# Altium footprint library PCB_LIB.PcbLib: 116 footprints (part 4 of 8)
Each footprint in its own frame and in the unit in brackets; x right, y up, seen from the top. Pads: shape width x height; smd on the part's side, far side on the other; paste and mask are expansions set on the pad; w line width, h text height; cw(c..) or ccw(c..) is an arc to the next point about the centre after c.
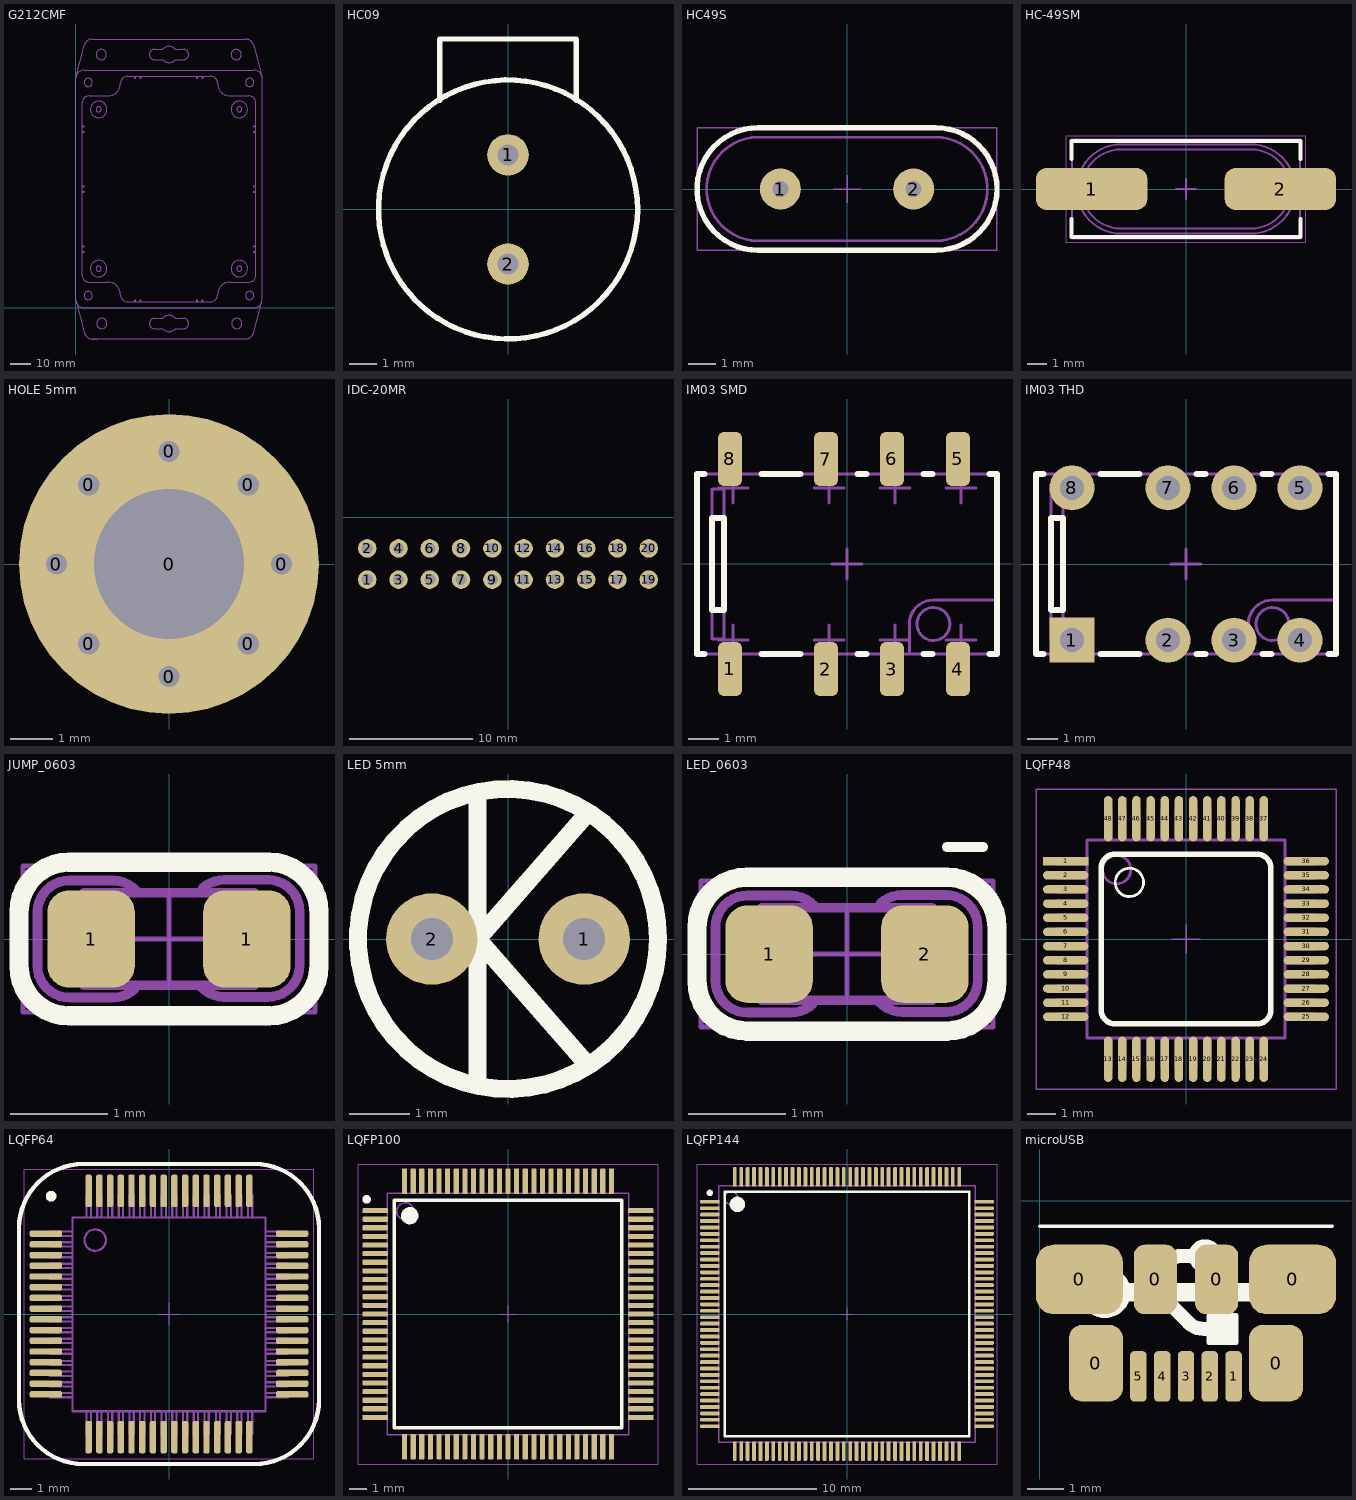
[diagram p3: the footprints below, top view; thin cyan lines are the x and y axes]

## G212CMF [mm]
Mechanical 1:
  circle w0.1: c77.75,-7.5 r2.5
  circle w0.1: c12.5,-7.5 r2.5
  circle w0.1: c84,6 r2
  circle w0.1: c79,19 r1.25
  circle w0.1: c79,19 r4
  circle w0.1: c6,6 r2
  circle w0.1: c11,19 r1.25
  circle w0.1: c11,19 r4
  circle w0.1: c79,96 r4
  circle w0.1: c79,96 r1.25
  circle w0.1: c84,109 r2
  circle w0.1: c11,96 r4
  circle w0.1: c11,96 r1.25
  circle w0.1: c6,109 r2
  circle w0.1: c77.5,122.5 r2.5
  circle w0.1: c12.25,122.5 r2.5
  lines w0.1: 3,27 4,27 4,27.5 3,27.5 ; 3,29.5 4,29.5 4,30 3,30 ; 3,55 3,99.086 cw(c6.414,99.086) 6.414,102.5 15.5,102.5 ccw(c15.5,108.5) 21.5,108.5 cw(c25,108.5) 25,112 ; 3,56 4,56 4,56.5 3,56.5 ; 3,58.5 4,58.5 4,59 3,59 ; 3,60 3,15.914 ccw(c6.414,15.914) 6.414,12.5 15.5,12.5 cw(c15.5,6.5) 21.5,6.5 ccw(c25,6.5) 25,3 ; 3,85 4,85 4,85.5 3,85.5 ; 3,87.5 4,87.5 4,88 3,88 ; 7.5,-15 80,-15 82,-15 ; 8,-15 10,-15 ; 8,130 10,130 82.5,130 ; 8.025,-15 cw(c8.025,-11) 4.158,-12.023 0,4 ; 8.025,130 ccw(c8.025,126) 4.158,127.023 0,111 ; 28.5,3 28.5,4 29,4 29,3 ; 28.5,112 28.5,111 29,111 29,112 ; 31,3 31,4 31.5,4 31.5,3 ; 31,112 31,111 31.5,111 31.5,112 ; 58.5,3 58.5,4 59,4 59,3 ; 58.5,112 58.5,111 59,111 59,112 ; 61,3 61,4 61.5,4 61.5,3 ; 61,112 61,111 61.5,111 61.5,112 ; 80,130 82,130 ; 81.975,-15 ccw(c81.975,-11) 85.842,-12.023 90,4 ; 81.975,130 cw(c81.975,126) 85.842,127.023 90,111 ; 87,27 86,27 86,27.5 87,27.5 ; 87,29.5 86,29.5 86,30 87,30 ; 87,55 87,99.086 ccw(c83.586,99.086) 83.586,102.5 74.5,102.5 cw(c74.5,108.5) 68.5,108.5 ccw(c65,108.5) 65,112 ; 87,56 86,56 86,56.5 87,56.5 ; 87,58.5 86,58.5 86,59 87,59 ; 87,60 87,15.914 cw(c83.586,15.914) 83.586,12.5 74.5,12.5 ccw(c74.5,6.5) 68.5,6.5 cw(c65,6.5) 65,3 ; 87,85 86,85 86,85.5 87,85.5 ; 87,87.5 86,87.5 86,88 87,88 ; 0,4 ccw(c4,4) 4,0 ; 0,4 ccw(c4,4) 4,0 ; 0,4 0,111 ; 0,111 cw(c4,111) 4,115 86,115 cw(c86,111) 90,111 ; 4,0 86,0 ; 4,0 86,0 ; 25,3 52,3 25,3 ; 25,112 52,112 25,112 ; 65,3 38,3 65,3 ; 65,112 38,112 65,112 ; 86,0 ccw(c86,4) 90,4 ; 86,0 ccw(c86,4) 90,4 ; 90,4 90,111 ; 38,-10 cw(c38,-7.5) 38,-5 42,-5 cw(c45,-7.5) 48,-5 52,-5 cw(c52,-7.5) 52,-10 48,-10 cw(c45,-7.5) 42,-10 38,-10 ; 38,120 cw(c38,122.5) 38,125 42,125 cw(c45,122.5) 48,125 52,125 cw(c52,122.5) 52,120 48,120 cw(c45,122.5) 42,120 38,120

## HC09 [mil]
pads (2):
  round 60 hole 30: 1(0,78.74) 2(0,-78.74)
Top Overlay:
  circle w7.87: c0,0 r187.01
  lines w7.87: -98.43,157.48 -98.43,246.06 ; 98.43,157.48 98.43,246.06 ; -98.43,246.06 -98.42,246.06 ; -98.43,246.06 -98.42,246.06 ; -98.42,246.06 98.43,246.06 ; 98.43,246.06 98.43,246.06

## HC49S [mm]
pads (2):
  round 1.5 hole 0.6: 1(-2.44,0) 2(2.44,0)
Top Overlay:
  lines w0.2: 3.239,-2.25 -3.25,-2.25 cw(c-3.25,0) -3.25,2.25 3.24,2.25 cw(c3.25,0) 3.239,-2.25
Mechanical 14:
  lines w0.1: 3.239,-2.25 -3.25,-2.25 cw(c-3.25,0) -3.25,2.25 3.24,2.25 cw(c3.25,0) 3.239,-2.25 ; -3.25,-1.9 cw(c-3.25,0) -3.25,1.9 3.242,1.9 cw(c3.25,0) 3.241,-1.9 -3.25,-1.9
  text ".Comment" at -2.5,-1.5 h1.5
  text ".Designator" at -5.75,-0.5 h2.8
Mechanical 15:
  lines w0.05: -0.5,0 0.5,0 ; 0,-0.5 0,0.5 ; -5.5,-2.25 5.5,-2.25 5.5,2.25 -5.5,2.25 -5.5,-2.25
3D body "HP49US.STEP": height 3.7, standoff -2.5, extent -5.5,-2.25 5.5,2.25

## HC-49SM [mm] "Crystal, 2-Leads, Body 4.70x11.40mm, Pitch 8.80mm, IPC Medium Density"
height 4.2
pads (2):
  rrect50% 5.6x2.1 smd: 1(-4.75,0) 2(4.75,0)
Top Overlay:
  lines w0.2: -5.775,-1.5 -5.775,-2.425 5.775,-2.425 5.775,-1.5 ; -5.775,1.5 -5.775,2.425 5.775,2.425 5.775,1.5
Mechanical 14:
  lines w0.1: -5.75,-1 -7,-1 cw(c-7,-0.5) -7.5,-0.5 -7.5,0.5 cw(c-7,0.5) -7,1 -5.75,1 ; -5.75,-0.5 -6.5,-0.5 -6.5,0.5 -5.75,0.5 ; 5.75,-1 7,-1 ccw(c7,-0.5) 7.5,-0.5 7.5,0.5 ccw(c7,0.5) 7,1 5.75,1 ; 5.75,-0.5 6.5,-0.5 6.5,0.5 5.75,0.5 ; -5.75,-2.5 5.75,-2.5 5.75,2.5 -5.75,2.5 -5.75,-2.5 ; -3.25,-2.25 cw(c-3.25,0) -3.25,2.25 3.25,2.25 cw(c3.25,0) 3.25,-2.25 -3.25,-2.25 ; -3.25,-2 cw(c-3.25,0) -3.25,2 3.25,2 cw(c3.25,0) 3.25,-2 -3.25,-2
  text ".Designator" at -5.825,-0.575 h2.8
  text ".Comment" at -2.75,-1.5 h1.5
Mechanical 15:
  lines w0.05: -6.025,-2.675 6.025,-2.675 6.025,2.675 -6.025,2.675 -6.025,-2.675
  lines w0.1: -0.5,0 0.5,0 ; 0,-0.5 0,0.5
3D body "HC49US SMT Crystal.STEP": height 4.2, standoff 0, extent -6.35,-2.35 6.35,2.35

## HOLE 5mm [mil]
pads (9):
  round 60 hole 19.68: 0(-103.35,0) 0(-73.53,-73.2) 0(-73.53,72.96) 0(0,-103.35) 0(0,103.35) 0(72.62,-73.2) 0(72.62,72.96) 0(103.35,0)
  round 275.59 hole 137.8: 0(0,0)

## IDC-20MR [mm]
pads (20):
  round 1.5 hole 0.9: 1(-11.43,-5.08) 2(-11.43,-2.54) 3(-8.89,-5.08) 4(-8.89,-2.54) 5(-6.35,-5.08) 6(-6.35,-2.54) 7(-3.81,-5.08) 8(-3.81,-2.54) 9(-1.27,-5.08) 10(-1.27,-2.54) 11(1.27,-5.08) 12(1.27,-2.54) 13(3.81,-5.08) 14(3.81,-2.54) 15(6.35,-5.08) 16(6.35,-2.54) 17(8.89,-5.08) 18(8.89,-2.54) 19(11.43,-5.08) 20(11.43,-2.54)
3D body "User Library-DS1013-20R (IDC-20R CONNFLY).step": height 8.9, standoff -3, extent -16.6,-5.4 16.6,8.62

## IM03 SMD [mm] "Relay, 8 Leads, Row Spacing 5.08 mm; Body 14.5mm x 7.2mm, AXICOM P2 Serie"
height 9.9
pads (8):
  rrect50% 0.8x1.8 smd: 1(-3.9,-3.5) 2(-0.7,-3.5) 3(1.5,-3.5) 4(3.7,-3.5) 5(3.7,3.5) 6(1.5,3.5) 7(-0.7,3.5) 8(-3.9,3.5)
Top Overlay:
  lines w0.2: -4.744,-3 -5,-3 -5,3 -4.744,3 ; -2.856,-3 -1.544,-3 ; -2.856,3 -1.544,3 ; 0.344,-3 0.656,-3 ; 0.344,3 0.656,3 ; 2.544,-3 2.856,-3 ; 2.544,3 2.856,3 ; 4.744,-3 5,-3 5,3 4.744,3 ; -4.5,-1.534 -4.5,1.534 -4.1,1.534 -4.1,-1.534 -4.5,-1.534
Mechanical 8:
  lines w0.1: -4.3,-2.54 -3.8,-2.54 ; -4.3,2.54 -3.8,2.54 ; -3.8,-3.04 -3.8,-2.54 ; -3.8,-2.04 -3.8,-2.54 ; -3.8,2.04 -3.8,2.54 ; -3.8,3.04 -3.8,2.54 ; -3.3,-2.54 -3.8,-2.54 ; -3.3,2.54 -3.8,2.54 ; -1.1,-2.54 -0.6,-2.54 ; -1.1,2.54 -0.6,2.54 ; -0.6,-3.04 -0.6,-2.54 ; -0.6,-2.04 -0.6,-2.54 ; -0.6,2.04 -0.6,2.54 ; -0.6,3.04 -0.6,2.54 ; -0.5,0 0,0 ; -0.1,-2.54 -0.6,-2.54 ; -0.1,2.54 -0.6,2.54 ; 0,-0.5 0,0 ; 0,0.5 0,0 ; 0.5,0 0,0 ; 1.1,-2.54 1.6,-2.54 ; 1.1,2.54 1.6,2.54 ; 1.6,-3.04 1.6,-2.54 ; 1.6,-2.04 1.6,-2.54 ; 1.6,2.04 1.6,2.54 ; 1.6,3.04 1.6,2.54 ; 2.1,-2.54 1.6,-2.54 ; 2.1,2.54 1.6,2.54 ; 3.3,-2.54 3.8,-2.54 ; 3.3,2.54 3.8,2.54 ; 3.8,-3.04 3.8,-2.54 ; 3.8,-2.04 3.8,-2.54 ; 3.8,2.04 3.8,2.54 ; 3.8,3.04 3.8,2.54 ; 4.3,-2.54 3.8,-2.54 ; 4.3,2.54 3.8,2.54
Mechanical 14:
  circle w0.1: c2.88,-2 r0.55
  lines w0.1: 2.08,-3 2.08,-2 cw(c2.88,-2) 2.88,-1.2 5,-1.2 ; -5,-3 5,-3 5,3 -5,3 -5,-3 ; -4.5,-2.5 -4.5,2.5 -4.1,2.5 -4.1,-2.5 -4.5,-2.5
  text ".Designator" at -6.096,0.203 h3
  text ".Comment" at -3.277,-1.118 h2
3D body "REL_OMRON_G6K-2F.stp": height 5.4, standoff 0, extent -5.1,-3.9 5.1,3.9

## IM03 THD [mm] "Relay, 8 Leads, Row Spacing 5.08 mm; Body 14.5mm x 7.2mm, AXICOM P2 Serie"
height 9.9
pads (8):
  rect 1.5x1.5 hole 0.8: 1(-3.8,-2.54)
  round 1.5 hole 0.8: 2(-0.6,-2.54) 3(1.6,-2.54) 4(3.8,-2.54) 5(3.8,2.54) 6(1.6,2.54) 7(-0.6,2.54) 8(-3.8,2.54)
Top Overlay:
  lines w0.2: -4.744,-3 -5,-3 -5,3 -4.744,3 ; -2.856,-3 -1.544,-3 ; -2.856,3 -1.544,3 ; 0.344,-3 0.656,-3 ; 0.344,3 0.656,3 ; 2.544,-3 2.856,-3 ; 2.544,3 2.856,3 ; 4.744,-3 5,-3 5,3 4.744,3 ; -4.5,-1.534 -4.1,-1.534 -4.1,1.534 -4.5,1.534 -4.5,-1.534
Mechanical 8:
  lines w0.1: -4.3,-2.54 -3.8,-2.54 ; -4.3,2.54 -3.8,2.54 ; -3.8,-3.04 -3.8,-2.54 ; -3.8,-2.04 -3.8,-2.54 ; -3.8,2.04 -3.8,2.54 ; -3.8,3.04 -3.8,2.54 ; -3.3,-2.54 -3.8,-2.54 ; -3.3,2.54 -3.8,2.54 ; -1.1,-2.54 -0.6,-2.54 ; -1.1,2.54 -0.6,2.54 ; -0.6,-3.04 -0.6,-2.54 ; -0.6,-2.04 -0.6,-2.54 ; -0.6,2.04 -0.6,2.54 ; -0.6,3.04 -0.6,2.54 ; -0.5,0 0,0 ; -0.1,-2.54 -0.6,-2.54 ; -0.1,2.54 -0.6,2.54 ; 0,-0.5 0,0 ; 0,0.5 0,0 ; 0.5,0 0,0 ; 1.1,-2.54 1.6,-2.54 ; 1.1,2.54 1.6,2.54 ; 1.6,-3.04 1.6,-2.54 ; 1.6,-2.04 1.6,-2.54 ; 1.6,2.04 1.6,2.54 ; 1.6,3.04 1.6,2.54 ; 2.1,-2.54 1.6,-2.54 ; 2.1,2.54 1.6,2.54 ; 3.3,-2.54 3.8,-2.54 ; 3.3,2.54 3.8,2.54 ; 3.8,-3.04 3.8,-2.54 ; 3.8,-2.04 3.8,-2.54 ; 3.8,2.04 3.8,2.54 ; 3.8,3.04 3.8,2.54 ; 4.3,-2.54 3.8,-2.54 ; 4.3,2.54 3.8,2.54
Mechanical 14:
  circle w0.1: c2.88,-2 r0.55
  lines w0.1: 2.08,-3 2.08,-2 cw(c2.88,-2) 2.88,-1.2 5,-1.2 ; -5,-3 -5,3 5,3 5,-3 -5,-3 ; -4.5,-2.5 -4.1,-2.5 -4.1,2.5 -4.5,2.5 -4.5,-2.5
  text ".Comment" at -3.277,-1.118 h2
  text ".Designator" at -6.096,0.203 h3
3D body "REL_TYCO_IMXXTX.stp": height 5.65, standoff -2.6, extent -5,-3 5,3

## JUMP_0603 [mm] "Chip Resistor, EIA 0603, Metric 1608, Body 1.6x0.8mm, IPC Medium Density"
height 0.55
pads (2):
  rrect50% 0.9x1 smd: 1(-0.8,0) 1(0.8,0)
Top Overlay:
  lines w0.2: -1.54,-0.275 ccw(c-1.025,-0.275) -1.025,-0.79 1.025,-0.79 ccw(c1.025,-0.275) 1.54,-0.275 1.54,0.275 ccw(c1.025,0.275) 1.025,0.79 -1.025,0.79 ccw(c-1.025,0.275) -1.54,0.275 -1.54,-0.275
Mechanical 14:
  lines w0.1: -0.358,-0.519 cw(c-0.575,-0.275) -0.575,-0.601 ; -0.333,0.493 ccw(c-0.575,0.275) -0.575,0.601 -1.025,0.601 ccw(c-1.025,0.275) -1.351,0.275 -1.351,-0.275 ccw(c-1.025,-0.275) -1.025,-0.601 -0.575,-0.601 ; 0.324,-0.487 ccw(c0.567,-0.269) 0.567,-0.595 1.017,-0.595 ccw(c1.017,-0.269) 1.343,-0.269 1.343,0.281 ccw(c1.017,0.281) 1.017,0.607 0.567,0.607 ; 0.35,0.525 cw(c0.567,0.281) 0.567,0.607 ; -0.575,-0.601 -0.575,-0.601 ; 0.567,0.607 0.567,0.607 ; -0.875,-0.475 -0.875,0.475 0.875,0.475 0.875,-0.475 -0.875,-0.475
  text ".Designator" at -1.397,-0.127 h0.7
  text ".Comment" at -0.508,-0.381 h0.3
Mechanical 15:
  lines w0.05: -0.5,0 0.5,0 ; 0,-0.5 0,0.5 ; -1.5,-0.75 1.5,-0.75 1.5,0.75 -1.5,0.75 -1.5,-0.75
3D body "RESC1608X55N.stp": height 0.55, standoff 0, extent -0.875,-0.475 0.875,0.475

## LED 5mm [mil]
pads (2):
  round 60 hole 27.56: 1(50,0) 2(-50,0)
Top Overlay:
  circle w11.81: c0,0 r98.43
  lines w11.81: -20,-90 -20,90 ; 50,-80 -20,0 50,80

## LED_0603 [mm] "Chip Resistor, EIA 0603, Metric 1608, Body 1.6x0.8mm, IPC Medium Density"
height 0.55
pads (2):
  rrect50% 0.9x1 smd: 1(-0.8,0) 2(0.8,0)
Top Overlay:
  lines w0.1: 1.025,1.1 1.4,1.1
  lines w0.2: -1.54,-0.275 ccw(c-1.025,-0.275) -1.025,-0.79 1.025,-0.79 ccw(c1.025,-0.275) 1.54,-0.275 1.54,0.275 ccw(c1.025,0.275) 1.025,0.79 -1.025,0.79 ccw(c-1.025,0.275) -1.54,0.275 -1.54,-0.275
Mechanical 14:
  lines w0.1: -0.358,-0.519 cw(c-0.575,-0.275) -0.575,-0.601 ; -0.333,0.493 ccw(c-0.575,0.275) -0.575,0.601 -1.025,0.601 ccw(c-1.025,0.275) -1.351,0.275 -1.351,-0.275 ccw(c-1.025,-0.275) -1.025,-0.601 -0.575,-0.601 ; 0.324,-0.487 ccw(c0.567,-0.269) 0.567,-0.595 1.017,-0.595 ccw(c1.017,-0.269) 1.343,-0.269 1.343,0.281 ccw(c1.017,0.281) 1.017,0.607 0.567,0.607 ; 0.35,0.525 cw(c0.567,0.281) 0.567,0.607 ; -0.575,-0.601 -0.575,-0.601 ; 0.567,0.607 0.567,0.607 ; -0.875,-0.475 0.875,-0.475 0.875,0.475 -0.875,0.475 -0.875,-0.475
  text ".Comment" at -0.508,-0.381 h0.3
  text ".Designator" at -1.397,-0.127 h0.7
Mechanical 15:
  lines w0.05: -0.5,0 0.5,0 ; 0,-0.5 0,0.5 ; -1.5,-0.75 -1.5,0.75 1.5,0.75 1.5,-0.75 -1.5,-0.75
3D body "User Library-led0603_GRE.step": height 1.1, standoff 0, extent -0.81,-0.4 0.81,0.4

## LQFP48 [mm] "QFP, 0.50mm Pitch, Square, 12 pin X 12 Pin, 7.00mm X 7.00mm X 1.20mm Body, IPC Medium Density"
height 1.2
pads (48):
  rect 1.6x0.3 smd: 1(-4.25,2.75)
  rrect100% 1.6x0.3 smd: 2(-4.25,2.25) 3(-4.25,1.75) 4(-4.25,1.25) 5(-4.25,0.75) 6(-4.25,0.25) 7(-4.25,-0.25) 8(-4.25,-0.75) 9(-4.25,-1.25) 10(-4.25,-1.75) 11(-4.25,-2.25) 12(-4.25,-2.75) 25(4.25,-2.75) 26(4.25,-2.25) 27(4.25,-1.75) 28(4.25,-1.25) 29(4.25,-0.75) 30(4.25,-0.25) 31(4.25,0.25) 32(4.25,0.75) 33(4.25,1.25) 34(4.25,1.75) 35(4.25,2.25) 36(4.25,2.75)
  rrect100% 0.3x1.6 smd: 13(-2.75,-4.25) 14(-2.25,-4.25) 15(-1.75,-4.25) 16(-1.25,-4.25) 17(-0.75,-4.25) 18(-0.25,-4.25) 19(0.25,-4.25) 20(0.75,-4.25) 21(1.25,-4.25) 22(1.75,-4.25) 23(2.25,-4.25) 24(2.75,-4.25) 37(2.75,4.25) 38(2.25,4.25) 39(1.75,4.25) 40(1.25,4.25) 41(0.75,4.25) 42(0.25,4.25) 43(-0.25,4.25) 44(-0.75,4.25) 45(-1.25,4.25) 46(-1.75,4.25) 47(-2.25,4.25) 48(-2.75,4.25)
Top Overlay:
  circle w0.1: c-2,2 r0.5
  lines w0.2: -3,-2.5 ccw(c-2.5,-2.5) -2.5,-3 2.5,-3 ccw(c2.5,-2.5) 3,-2.5 3,-2 3,2.5 ccw(c2.5,2.5) 2.5,3 -2.5,3 ccw(c-2.5,2.5) -3,2.5 -3,-2.5
Mechanical 14:
  circle w0.1: c-2.45,2.45 r0.5
  lines w0.1: -3.5,-2.85 -4.55,-2.85 -4.55,-2.65 -3.5,-2.65 ; -3.5,-2.35 -4.55,-2.35 -4.55,-2.15 -3.5,-2.15 ; -3.5,-1.85 -4.55,-1.85 -4.55,-1.65 -3.5,-1.65 ; -3.5,-1.35 -4.55,-1.35 -4.55,-1.15 -3.5,-1.15 ; -3.5,-0.85 -4.55,-0.85 -4.55,-0.65 -3.5,-0.65 ; -3.5,-0.35 -4.55,-0.35 -4.55,-0.15 -3.5,-0.15 ; -3.5,0.15 -4.55,0.15 -4.55,0.35 -3.5,0.35 ; -3.5,0.65 -4.55,0.65 -4.55,0.85 -3.5,0.85 ; -3.5,1.15 -4.55,1.15 -4.55,1.35 -3.5,1.35 ; -3.5,1.65 -4.55,1.65 -4.55,1.85 -3.5,1.85 ; -3.5,2.15 -4.55,2.15 -4.55,2.35 -3.5,2.35 ; -3.5,2.65 -4.55,2.65 -4.55,2.85 -3.5,2.85 ; -2.85,-3.5 -2.85,-4.55 -2.65,-4.55 -2.65,-3.5 ; -2.85,3.5 -2.85,4.55 -2.65,4.55 -2.65,3.5 ; -2.35,-3.5 -2.35,-4.55 -2.15,-4.55 -2.15,-3.5 ; -2.35,3.5 -2.35,4.55 -2.15,4.55 -2.15,3.5 ; -1.85,-3.5 -1.85,-4.55 -1.65,-4.55 -1.65,-3.5 ; -1.85,3.5 -1.85,4.55 -1.65,4.55 -1.65,3.5 ; -1.35,-3.5 -1.35,-4.55 -1.15,-4.55 -1.15,-3.5 ; -1.35,3.5 -1.35,4.55 -1.15,4.55 -1.15,3.5 ; -0.85,-3.5 -0.85,-4.55 -0.65,-4.55 -0.65,-3.5 ; -0.85,3.5 -0.85,4.55 -0.65,4.55 -0.65,3.5 ; -0.35,-3.5 -0.35,-4.55 -0.15,-4.55 -0.15,-3.5 ; -0.35,3.5 -0.35,4.55 -0.15,4.55 -0.15,3.5 ; 0.15,-3.5 0.15,-4.55 0.35,-4.55 0.35,-3.5 ; 0.15,3.5 0.15,4.55 0.35,4.55 0.35,3.5 ; 0.65,-3.5 0.65,-4.55 0.85,-4.55 0.85,-3.5 ; 0.65,3.5 0.65,4.55 0.85,4.55 0.85,3.5 ; 1.15,-3.5 1.15,-4.55 1.35,-4.55 1.35,-3.5 ; 1.15,3.5 1.15,4.55 1.35,4.55 1.35,3.5 ; 1.65,-3.5 1.65,-4.55 1.85,-4.55 1.85,-3.5 ; 1.65,3.5 1.65,4.55 1.85,4.55 1.85,3.5 ; 2.15,-3.5 2.15,-4.55 2.35,-4.55 2.35,-3.5 ; 2.15,3.5 2.15,4.55 2.35,4.55 2.35,3.5 ; 2.65,-3.5 2.65,-4.55 2.85,-4.55 2.85,-3.5 ; 2.65,3.5 2.65,4.55 2.85,4.55 2.85,3.5 ; 3.5,-2.85 4.55,-2.85 4.55,-2.65 3.5,-2.65 ; 3.5,-2.35 4.55,-2.35 4.55,-2.15 3.5,-2.15 ; 3.5,-1.85 4.55,-1.85 4.55,-1.65 3.5,-1.65 ; 3.5,-1.35 4.55,-1.35 4.55,-1.15 3.5,-1.15 ; 3.5,-0.85 4.55,-0.85 4.55,-0.65 3.5,-0.65 ; 3.5,-0.35 4.55,-0.35 4.55,-0.15 3.5,-0.15 ; 3.5,0.15 4.55,0.15 4.55,0.35 3.5,0.35 ; 3.5,0.65 4.55,0.65 4.55,0.85 3.5,0.85 ; 3.5,1.15 4.55,1.15 4.55,1.35 3.5,1.35 ; 3.5,1.65 4.55,1.65 4.55,1.85 3.5,1.85 ; 3.5,2.15 4.55,2.15 4.55,2.35 3.5,2.35 ; 3.5,2.65 4.55,2.65 4.55,2.85 3.5,2.85 ; -3.5,-3.5 3.5,-3.5 3.5,3.5 -3.5,3.5 -3.5,-3.5
  text ".Comment" at -1.75,-3 h1
  text ".Designator" at -6.25,-1.25 h3
Mechanical 15:
  lines w0.05: -0.5,0 0.5,0 ; 0,-0.5 0,0.5 ; -5.3,-5.3 5.3,-5.3 5.3,5.3 -5.3,5.3 -5.3,-5.3
3D body "QFP50P900X900X120-48N.stp": height 1.2, standoff 0, extent -4.6,-4.6 4.6,4.6

## LQFP64 [mm] "QFP, 0.50mm Pitch, Square; 64 Pin, 10.00mm L X 10.00mm W X 1.00mm H body (w/thermal tab 3.42 X 3.42mm), IPC Medium Density"
height 1
pads (64):
  rrect50% 1.5x0.3 smd: 1(-5.75,3.75) 2(-5.75,3.25) 3(-5.75,2.75) 4(-5.75,2.25) 5(-5.75,1.75) 6(-5.75,1.25) 7(-5.75,0.75) 8(-5.75,0.25) 9(-5.75,-0.25) 10(-5.75,-0.75) 11(-5.75,-1.25) 12(-5.75,-1.75) 13(-5.75,-2.25) 14(-5.75,-2.75) 15(-5.75,-3.25) 16(-5.75,-3.75) 33(5.75,-3.75) 34(5.75,-3.25) 35(5.75,-2.75) 36(5.75,-2.25) 37(5.75,-1.75) 38(5.75,-1.25) 39(5.75,-0.75) 40(5.75,-0.25) 41(5.75,0.25) 42(5.75,0.75) 43(5.75,1.25) 44(5.75,1.75) 45(5.75,2.25) 46(5.75,2.75) 47(5.75,3.25) 48(5.75,3.75)
  rrect50% 0.3x1.5 smd: 17(-3.75,-5.75) 18(-3.25,-5.75) 19(-2.75,-5.75) 20(-2.25,-5.75) 21(-1.75,-5.75) 22(-1.25,-5.75) 23(-0.75,-5.75) 24(-0.25,-5.75) 25(0.25,-5.75) 26(0.75,-5.75) 27(1.25,-5.75) 28(1.75,-5.75) 29(2.25,-5.75) 30(2.75,-5.75) 31(3.25,-5.75) 32(3.75,-5.75) 49(3.75,5.75) 50(3.25,5.75) 51(2.75,5.75) 52(2.25,5.75) 53(1.75,5.75) 54(1.25,5.75) 55(0.75,5.75) 56(0.25,5.75) 57(-0.25,5.75) 58(-0.75,5.75) 59(-1.25,5.75) 60(-1.75,5.75) 61(-2.25,5.75) 62(-2.75,5.75) 63(-3.25,5.75) 64(-3.75,5.75)
Top Overlay:
  circle w0.25: c-5.5,5.5 r0.125
  lines w0.2: -7,-4 ccw(c-4,-4) -4,-7 4,-7 ccw(c4,-4) 7,-4 7,4 ccw(c4,4) 4,7 -4,7 ccw(c-4,4) -7,4 -7,-4
Mechanical 14:
  drawing of 197 lines, arcs and shapes, not listed
  text ".Designator" at -10.338,-2.032 h3.5
  text ".Comment" at -8.179,-8.687 h1.5
Mechanical 15:
  lines w0.05: -0.5,0 0.5,0 ; 0,-0.5 0,0.5 ; -6.75,-6.75 6.75,-6.75 6.75,6.75 -6.75,6.75 -6.75,-6.75
3D body "QFP50P1200X1200X100-65N-S342.stp": height 1, standoff 0, extent -6.1,-6.1 6.1,6.1

## LQFP100 [mm] "QFP, 0.50mm Pitch, Square; 100 Pin,14.00mm L X 14.00mm W X 1.20mm H Body, IPC Medium Density"
height 1.2
pads (100):
  rrect50% 1.5x0.3 smd: 1(-7.7,6) 2(-7.7,5.5) 3(-7.7,5) 4(-7.7,4.5) 5(-7.7,4) 6(-7.7,3.5) 7(-7.7,3) 8(-7.7,2.5) 9(-7.7,2) 10(-7.7,1.5) 11(-7.7,1) 12(-7.7,0.5) 13(-7.7,0) 14(-7.7,-0.5) 15(-7.7,-1) 16(-7.7,-1.5) 17(-7.7,-2) 18(-7.7,-2.5) 19(-7.7,-3) 20(-7.7,-3.5) 21(-7.7,-4) 22(-7.7,-4.5) 23(-7.7,-5) 24(-7.7,-5.5) 25(-7.7,-6) 51(7.7,-6) 52(7.7,-5.5) 53(7.7,-5) 54(7.7,-4.5) 55(7.7,-4) 56(7.7,-3.5) 57(7.7,-3) 58(7.7,-2.5) 59(7.7,-2) 60(7.7,-1.5) 61(7.7,-1) 62(7.7,-0.5) 63(7.7,0) 64(7.7,0.5) 65(7.7,1) 66(7.7,1.5) 67(7.7,2) 68(7.7,2.5) 69(7.7,3) 70(7.7,3.5) 71(7.7,4) 72(7.7,4.5) 73(7.7,5) 74(7.7,5.5) 75(7.7,6)
  rrect50% 0.3x1.5 smd: 26(-6,-7.7) 27(-5.5,-7.7) 28(-5,-7.7) 29(-4.5,-7.7) 30(-4,-7.7) 31(-3.5,-7.7) 32(-3,-7.7) 33(-2.5,-7.7) 34(-2,-7.7) 35(-1.5,-7.7) 36(-1,-7.7) 37(-0.5,-7.7) 38(0,-7.7) 39(0.5,-7.7) 40(1,-7.7) 41(1.5,-7.7) 42(2,-7.7) 43(2.5,-7.7) 44(3,-7.7) 45(3.5,-7.7) 46(4,-7.7) 47(4.5,-7.7) 48(5,-7.7) 49(5.5,-7.7) 50(6,-7.7) 76(6,7.7) 77(5.5,7.7) 78(5,7.7) 79(4.5,7.7) 80(4,7.7) 81(3.5,7.7) 82(3,7.7) 83(2.5,7.7) 84(2,7.7) 85(1.5,7.7) 86(1,7.7) 87(0.5,7.7) 88(0,7.7) 89(-0.5,7.7) 90(-1,7.7) 91(-1.5,7.7) 92(-2,7.7) 93(-2.5,7.7) 94(-3,7.7) 95(-3.5,7.7) 96(-4,7.7) 97(-4.5,7.7) 98(-5,7.7) 99(-5.5,7.7) 100(-6,7.7)
Top Overlay:
  circle w0.5: c-5.7,5.7 r0.25
  circle w0.25: c-8.2,6.65 r0.125
  lines w0.2: -6.6,-6.6 -6.6,6.6 6.6,6.6 6.6,-6.6 -6.6,-6.6
Mechanical 14:
  circle w0.1: c-5.95,5.95 r0.5
  lines w0.1: -7,7 -7,-7 7,-7 7,7 ; -7,7 7,7 ; -7,7 7,7
Mechanical 15:
  lines w0.05: -0.5,0 0.5,0 ; 0,-0.5 0,0.5 ; -8.7,-8.7 8.7,-8.7 8.7,8.7 -8.7,8.7 -8.7,-8.7
3D body "QFP50P1600X1600X120-100N.stp": height 1.2, standoff 0, extent -8,-8 8,8

## LQFP144 [mm] "QFP, 144-Leads, Body 20x20mm (BSC), Pitch 0.50mm, IPC Medium Density"
height 1.6
pads (144):
  rrect50% 1.5x0.3 smd: 1(-10.7,8.75) 2(-10.7,8.25) 3(-10.7,7.75) 4(-10.7,7.25) 5(-10.7,6.75) 6(-10.7,6.25) 7(-10.7,5.75) 8(-10.7,5.25) 9(-10.7,4.75) 10(-10.7,4.25) 11(-10.7,3.75) 12(-10.7,3.25) 13(-10.7,2.75) 14(-10.7,2.25) 15(-10.7,1.75) 16(-10.7,1.25) 17(-10.7,0.75) 18(-10.7,0.25) 19(-10.7,-0.25) 20(-10.7,-0.75) 21(-10.7,-1.25) 22(-10.7,-1.75) 23(-10.7,-2.25) 24(-10.7,-2.75) 25(-10.7,-3.25) 26(-10.7,-3.75) 27(-10.7,-4.25) 28(-10.7,-4.75) 29(-10.7,-5.25) 30(-10.7,-5.75) 31(-10.7,-6.25) 32(-10.7,-6.75) 33(-10.7,-7.25) 34(-10.7,-7.75) 35(-10.7,-8.25) 36(-10.7,-8.75) 73(10.7,-8.75) 74(10.7,-8.25) 75(10.7,-7.75) 76(10.7,-7.25) 77(10.7,-6.75) 78(10.7,-6.25) 79(10.7,-5.75) 80(10.7,-5.25) 81(10.7,-4.75) 82(10.7,-4.25) 83(10.7,-3.75) 84(10.7,-3.25) 85(10.7,-2.75) 86(10.7,-2.25) 87(10.7,-1.75) 88(10.7,-1.25) 89(10.7,-0.75) 90(10.7,-0.25) 91(10.7,0.25) 92(10.7,0.75) 93(10.7,1.25) 94(10.7,1.75) 95(10.7,2.25) 96(10.7,2.75) 97(10.7,3.25) 98(10.7,3.75) 99(10.7,4.25) 100(10.7,4.75) 101(10.7,5.25) 102(10.7,5.75) 103(10.7,6.25) 104(10.7,6.75) 105(10.7,7.25) 106(10.7,7.75) 107(10.7,8.25) 108(10.7,8.75)
  rrect50% 0.3x1.5 smd: 37(-8.75,-10.7) 38(-8.25,-10.7) 39(-7.75,-10.7) 40(-7.25,-10.7) 41(-6.75,-10.7) 42(-6.25,-10.7) 43(-5.75,-10.7) 44(-5.25,-10.7) 45(-4.75,-10.7) 46(-4.25,-10.7) 47(-3.75,-10.7) 48(-3.25,-10.7) 49(-2.75,-10.7) 50(-2.25,-10.7) 51(-1.75,-10.7) 52(-1.25,-10.7) 53(-0.75,-10.7) 54(-0.25,-10.7) 55(0.25,-10.7) 56(0.75,-10.7) 57(1.25,-10.7) 58(1.75,-10.7) 59(2.25,-10.7) 60(2.75,-10.7) 61(3.25,-10.7) 62(3.75,-10.7) 63(4.25,-10.7) 64(4.75,-10.7) 65(5.25,-10.7) 66(5.75,-10.7) 67(6.25,-10.7) 68(6.75,-10.7) 69(7.25,-10.7) 70(7.75,-10.7) 71(8.25,-10.7) 72(8.75,-10.7) 109(8.75,10.7) 110(8.25,10.7) 111(7.75,10.7) 112(7.25,10.7) 113(6.75,10.7) 114(6.25,10.7) 115(5.75,10.7) 116(5.25,10.7) 117(4.75,10.7) 118(4.25,10.7) 119(3.75,10.7) 120(3.25,10.7) 121(2.75,10.7) 122(2.25,10.7) 123(1.75,10.7) 124(1.25,10.7) 125(0.75,10.7) 126(0.25,10.7) 127(-0.25,10.7) 128(-0.75,10.7) 129(-1.25,10.7) 130(-1.75,10.7) 131(-2.25,10.7) 132(-2.75,10.7) 133(-3.25,10.7) 134(-3.75,10.7) 135(-4.25,10.7) 136(-4.75,10.7) 137(-5.25,10.7) 138(-5.75,10.7) 139(-6.25,10.7) 140(-6.75,10.7) 141(-7.25,10.7) 142(-7.75,10.7) 143(-8.25,10.7) 144(-8.75,10.7)
Top Overlay:
  circle w0.25: c-10.7,9.45 r0.125
  circle w0.6: c-8.55,8.55 r0.3
  lines w0.2: -9.55,-9.55 -9.55,9.55 9.55,9.55 9.55,-9.55 -9.55,-9.55
Mechanical 14:
  circle w0.1: c-9.05,9.05 r0.5
  lines w0.1: -10,-10 -10,10 10,10 10,-10 -10,-10
Mechanical 15:
  lines w0.05: -0.5,0 0.5,0 ; 0,-0.5 0,0.5 ; -11.7,-11.7 -11.7,11.7 11.7,11.7 11.7,-11.7 -11.7,-11.7
3D body "QFP50P2200X2200X160-144N.stp": height 1.6, standoff 0, extent -11,-11 11,11

## microUSB [mm]
pads (11):
  rrect50% 2.375x1.9 smd: 0(1.086,-2.15) 0(6.911,-2.15)
  rrect50% 1.475x2.1 smd: 0(1.536,-4.44) 0(6.461,-4.44)
  rrect50% 1.175x1.9 smd: 0(3.161,-2.15) 0(4.836,-2.15)
  rrect50% 0.45x1.38 smd: 1(5.298,-4.8) 2(4.648,-4.8) 3(3.999,-4.8) 4(3.349,-4.8) 5(2.699,-4.8)
Top Overlay:
  circle w0.508: c4.523,-1.507 r0.2
  circle w0.889: c1.789,-2.503 r0.254
  region: 5.374,-3.878 4.624,-3.878 4.623,-3.128 5.374,-3.128
  region: 6.724,-2.503 6.024,-3.003 6.024,-2.003
  lines w0.1: 0,-0.7 8,-0.7
  lines w0.127: 4.624,-3.878 5.374,-3.878 5.374,-3.128 4.623,-3.128 4.624,-3.878 ; 6.024,-3.003 6.024,-2.003 6.724,-2.503 6.024,-3.003
  lines w0.381: 2.583,-2.568 3.456,-1.695 cw(c3.909,-2.148) 3.909,-1.507 4.497,-1.507 ; 3.298,-2.566 4.048,-3.316 ccw(c4.5,-2.863) 4.5,-3.503 5.005,-3.503
  lines w0.508: 1.83,-2.503 6.275,-2.503
3D body "Micro USB.STP": height 2.71, standoff -0.23, extent 0,-5.43 7.98,0